# Altium footprint library ref-packages.PCBLIB: 1544 footprints (part 47 of 103)
Each footprint in its own frame and in the unit in brackets; x right, y up, seen from the top. Pads: shape width x height; smd on the part's side, far side on the other; paste and mask are expansions set on the pad; w line width, h text height; cw(c..) or ccw(c..) is an arc to the next point about the centre after c.
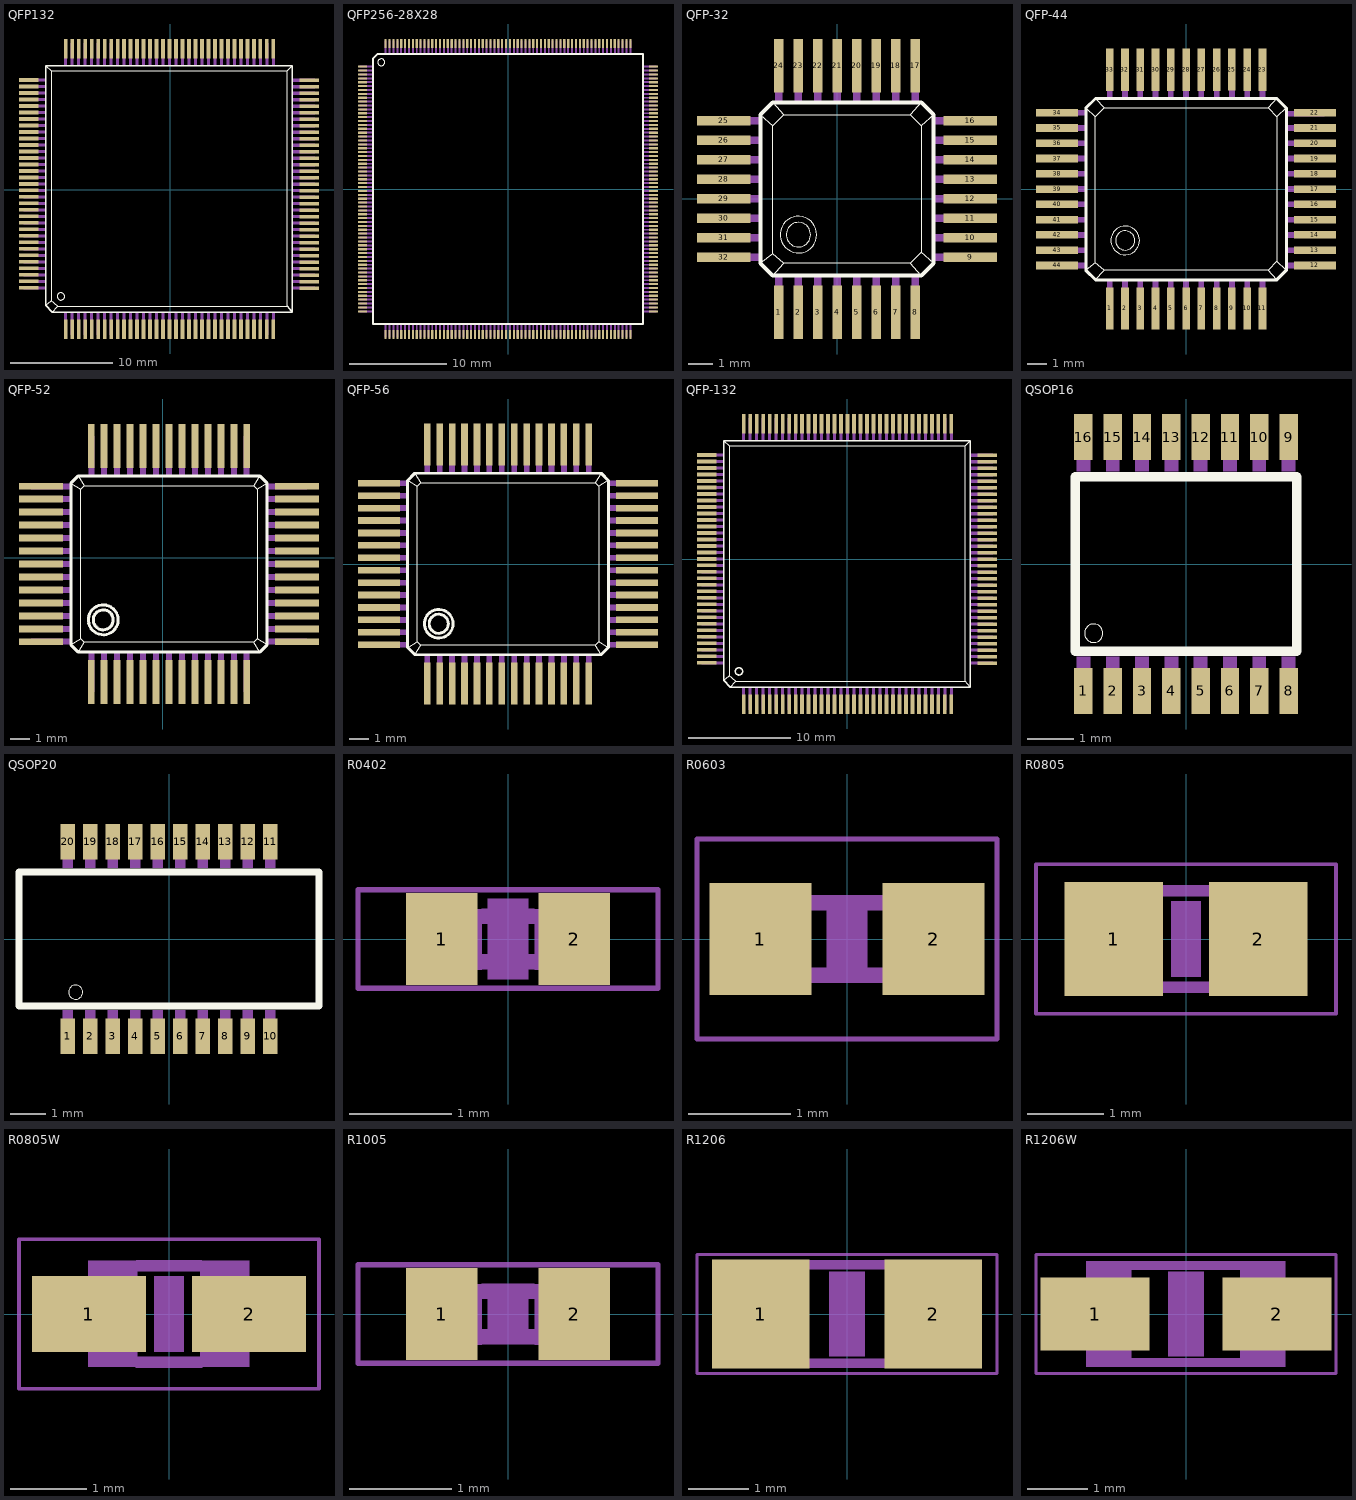
[diagram p46: the footprints below, top view; thin cyan lines are the x and y axes]

## QFP132 [mil]
pads (132):
  rect 14x75 smd: 1(-402,-537) 2(-377,-537) 3(-352,-537) 4(-327,-537) 5(-302,-537) 6(-277,-537) 7(-252,-537) 8(-227,-537) 9(-202,-537) 10(-177,-537) 11(-152,-537) 12(-127,-537) 13(-102,-537) 14(-77,-537) 15(-52,-537) 16(-27,-537) 17(-2,-537) 18(23,-537) 19(48,-537) 20(73,-537) 21(98,-537) 22(123,-537) 23(148,-537) 24(173,-537) 25(198,-537) 26(223,-537) 27(248,-537) 28(273,-537) 29(298,-537) 30(323,-537) 31(348,-537) 32(373,-537) 33(398,-537) 67(398,542) 68(373,542) 69(348,542) 70(323,542) 71(298,542) 72(273,542) 73(248,542) 74(223,542) 75(198,542) 76(173,542) 77(148,542) 78(123,542) 79(98,542) 80(73,542) 81(48,542) 82(23,542) 83(-2,542) 84(-27,542) 85(-52,542) 86(-77,542) 87(-102,542) 88(-127,542) 89(-152,542) 90(-177,542) 91(-202,542) 92(-227,542) 93(-252,542) 94(-277,542) 95(-302,542) 96(-327,542) 97(-352,542) 98(-377,542) 99(-402,542)
  rect 75x14 smd: 34(536,-379) 35(536,-354) 36(536,-329) 37(536,-304) 38(536,-279) 39(536,-254) 40(536,-229) 41(536,-204) 42(536,-179) 43(536,-154) 44(536,-129) 45(536,-104) 46(536,-79) 47(536,-54) 48(536,-29) 49(536,-4) 50(536,21) 51(536,46) 52(536,71) 53(536,96) 54(536,121) 55(536,146) 56(536,171) 57(536,196) 58(536,221) 59(536,246) 60(536,271) 61(536,296) 62(536,321) 63(536,346) 64(536,371) 65(536,396) 66(536,421) 100(-544,422) 101(-544,397) 102(-544,372) 103(-544,347) 104(-544,322) 105(-544,297) 106(-544,272) 107(-544,247) 108(-544,222) 109(-544,197) 110(-544,172) 111(-544,147) 112(-544,122) 113(-544,97) 114(-544,72) 115(-544,47) 116(-544,22) 117(-544,-3) 118(-544,-28) 119(-544,-53) 120(-544,-78) 121(-544,-103) 122(-544,-128) 123(-544,-153) 124(-544,-178) 125(-544,-203) 126(-544,-228) 127(-544,-253) 128(-544,-278) 129(-544,-303) 130(-544,-328) 131(-544,-353) 132(-544,-378)
Top Overlay:
  circle w2: c-420,-411 r14
  lines w2: -478,-445 -457,-428 ; -478,477 -457,457 ; -453,-472 -433,-449 ; 471,477 452,457 ; -457,-428 -457,457 ; -457,-428 -433,-449 ; -457,457 452,457 ; -433,-449 452,-449 452,457
  lines w6: 452,-449 471,-472 ; 471,-472 471,477 -478,477 -478,-445 -453,-472 471,-472
Mechanical 16:
  rectangle: 473,415 558,427
  rectangle: 473,390 558,402
  rectangle: 473,365 558,377
  rectangle: 473,340 558,352
  rectangle: 473,315 558,327
  rectangle: 473,290 558,302
  rectangle: 473,265 558,277
  rectangle: 473,240 558,252
  rectangle: 473,215 558,227
  rectangle: 473,190 558,202
  rectangle: 473,165 558,177
  rectangle: 473,140 558,152
  rectangle: 473,115 558,127
  rectangle: 473,90 558,102
  rectangle: 473,65 558,77
  rectangle: 473,40 558,52
  rectangle: 473,15 558,27
  rectangle: 473,-10 558,2
  rectangle: 473,-35 558,-23
  rectangle: 473,-60 558,-48
  rectangle: 473,-85 558,-73
  rectangle: 473,-110 558,-98
  rectangle: 473,-135 558,-123
  rectangle: 473,-160 558,-148
  rectangle: 473,-185 558,-173
  rectangle: 473,-210 558,-198
  rectangle: 473,-235 558,-223
  rectangle: 473,-260 558,-248
  rectangle: 473,-285 558,-273
  rectangle: 473,-310 558,-298
  rectangle: 473,-335 558,-323
  rectangle: 473,-360 558,-348
  rectangle: 473,-385 558,-373
  rectangle: 317,479 329,564
  rectangle: 292,479 304,564
  rectangle: 267,479 279,564
  rectangle: 242,479 254,564
  rectangle: 217,479 229,564
  rectangle: 192,479 204,564
  rectangle: 167,479 179,564
  rectangle: 142,479 154,564
  rectangle: 117,479 129,564
  rectangle: 92,479 104,564
  rectangle: 67,479 79,564
  rectangle: 42,479 54,564
  rectangle: 17,479 29,564
  rectangle: -8,479 4,564
  rectangle: -33,479 -21,564
  rectangle: -58,479 -46,564
  rectangle: -83,479 -71,564
  rectangle: -108,479 -96,564
  rectangle: -133,479 -121,564
  rectangle: -158,479 -146,564
  rectangle: -183,479 -171,564
  rectangle: -208,479 -196,564
  rectangle: -233,479 -221,564
  rectangle: -258,479 -246,564
  rectangle: -283,479 -271,564
  rectangle: -308,479 -296,564
  rectangle: -333,479 -321,564
  rectangle: -358,479 -346,564
  rectangle: -383,479 -371,564
  rectangle: -408,479 -396,564
  rectangle: 342,479 354,564
  rectangle: 367,479 379,564
  rectangle: 392,479 404,564
  rectangle: -565,416 -480,428
  rectangle: -565,391 -480,403
  rectangle: -565,366 -480,378
  rectangle: -565,341 -480,353
  rectangle: -565,316 -480,328
  rectangle: -565,291 -480,303
  rectangle: -565,266 -480,278
  rectangle: -565,241 -480,253
  rectangle: -565,216 -480,228
  rectangle: -565,191 -480,203
  rectangle: -565,166 -480,178
  rectangle: -565,141 -480,153
  rectangle: -565,116 -480,128
  rectangle: -565,91 -480,103
  rectangle: -565,66 -480,78
  rectangle: -565,41 -480,53
  rectangle: -565,16 -480,28
  rectangle: -565,-9 -480,3
  rectangle: -565,-34 -480,-22
  rectangle: -565,-59 -480,-47
  rectangle: -565,-84 -480,-72
  rectangle: -565,-109 -480,-97
  rectangle: -565,-134 -480,-122
  rectangle: -565,-159 -480,-147
  rectangle: -565,-184 -480,-172
  rectangle: -565,-209 -480,-197
  rectangle: -565,-234 -480,-222
  rectangle: -565,-259 -480,-247
  rectangle: -565,-284 -480,-272
  rectangle: -565,-309 -480,-297
  rectangle: -565,-334 -480,-322
  rectangle: -565,-359 -480,-347
  rectangle: -565,-384 -480,-372
  rectangle: 392,-559 404,-474
  rectangle: 367,-559 379,-474
  rectangle: 342,-559 354,-474
  rectangle: 317,-559 329,-474
  rectangle: 292,-559 304,-474
  rectangle: 267,-559 279,-474
  rectangle: 242,-559 254,-474
  rectangle: 217,-559 229,-474
  rectangle: 192,-559 204,-474
  rectangle: 167,-559 179,-474
  rectangle: 142,-559 154,-474
  rectangle: 117,-559 129,-474
  rectangle: 92,-559 104,-474
  rectangle: 67,-559 79,-474
  rectangle: 42,-559 54,-474
  rectangle: 17,-559 29,-474
  rectangle: -8,-559 4,-474
  rectangle: -33,-559 -21,-474
  rectangle: -58,-559 -46,-474
  rectangle: -83,-559 -71,-474
  rectangle: -108,-559 -96,-474
  rectangle: -133,-559 -121,-474
  rectangle: -158,-559 -146,-474
  rectangle: -183,-559 -171,-474
  rectangle: -208,-559 -196,-474
  rectangle: -233,-559 -221,-474
  rectangle: -258,-559 -246,-474
  rectangle: -283,-559 -271,-474
  rectangle: -308,-559 -296,-474
  rectangle: -333,-559 -321,-474
  rectangle: -358,-559 -346,-474
  rectangle: -383,-559 -371,-474
  rectangle: -408,-559 -396,-474

## QFP256-28X28 [mm]
pads (256):
  rect 0.9x0.22 smd: 1(-14.975,12.6) 2(-14.975,12.2) 3(-14.975,11.8) 4(-14.975,11.4) 5(-14.975,11) 6(-14.975,10.6) 7(-14.975,10.2) 8(-14.975,9.8) 9(-14.975,9.4) 10(-14.975,9) 11(-14.975,8.6) 12(-14.975,8.2) 13(-14.975,7.8) 14(-14.975,7.4) 15(-14.975,7) 16(-14.975,6.6) 17(-14.975,6.2) 18(-14.975,5.8) 19(-14.975,5.4) 20(-14.975,5) 21(-14.975,4.6) 22(-14.975,4.2) 23(-14.975,3.8) 24(-14.975,3.4) 25(-14.975,3) 26(-14.975,2.6) 27(-14.975,2.2) 28(-14.975,1.8) 29(-14.975,1.4) 30(-14.975,1) 31(-14.975,0.6) 32(-14.975,0.2) 33(-14.975,-0.2) 34(-14.975,-0.6) 35(-14.975,-1) 36(-14.975,-1.4) 37(-14.975,-1.8) 38(-14.975,-2.2) 39(-14.975,-2.6) 40(-14.975,-3) 41(-14.975,-3.4) 42(-14.975,-3.8) 43(-14.975,-4.2) 44(-14.975,-4.6) 45(-14.975,-5) 46(-14.975,-5.4) 47(-14.975,-5.8) 48(-14.975,-6.2) 49(-14.975,-6.6) 50(-14.975,-7) 51(-14.975,-7.4) 52(-14.975,-7.8) 53(-14.975,-8.2) 54(-14.975,-8.6) 55(-14.975,-9) 56(-14.975,-9.4) 57(-14.975,-9.8) 58(-14.975,-10.2) 59(-14.975,-10.6) 60(-14.975,-11) 61(-14.975,-11.4) 62(-14.975,-11.8) 63(-14.975,-12.2) 64(-14.975,-12.6) 129(14.975,-12.6) 130(14.975,-12.2) 131(14.975,-11.8) 132(14.975,-11.4) 133(14.975,-11) 134(14.975,-10.6) 135(14.975,-10.2) 136(14.975,-9.8) 137(14.975,-9.4) 138(14.975,-9) 139(14.975,-8.6) 140(14.975,-8.2) 141(14.975,-7.8) 142(14.975,-7.4) 143(14.975,-7) 144(14.975,-6.6) 145(14.975,-6.2) 146(14.975,-5.8) 147(14.975,-5.4) 148(14.975,-5) 149(14.975,-4.6) 150(14.975,-4.2) 151(14.975,-3.8) 152(14.975,-3.4) 153(14.975,-3) 154(14.975,-2.6) 155(14.975,-2.2) 156(14.975,-1.8) 157(14.975,-1.4) 158(14.975,-1) 159(14.975,-0.6) 160(14.975,-0.2) 161(14.975,0.2) 162(14.975,0.6) 163(14.975,1) 164(14.975,1.4) 165(14.975,1.8) 166(14.975,2.2) 167(14.975,2.6) 168(14.975,3) 169(14.975,3.4) 170(14.975,3.8) 171(14.975,4.2) 172(14.975,4.6) 173(14.975,5) 174(14.975,5.4) 175(14.975,5.8) 176(14.975,6.2) 177(14.975,6.6) 178(14.975,7) 179(14.975,7.4) 180(14.975,7.8) 181(14.975,8.2) 182(14.975,8.6) 183(14.975,9) 184(14.975,9.4) 185(14.975,9.8) 186(14.975,10.2) 187(14.975,10.6) 188(14.975,11) 189(14.975,11.4) 190(14.975,11.8) 191(14.975,12.2) 192(14.975,12.6)
  rect 0.22x0.9 smd: 65(-12.6,-14.975) 66(-12.2,-14.975) 67(-11.8,-14.975) 68(-11.4,-14.975) 69(-11,-14.975) 70(-10.6,-14.975) 71(-10.2,-14.975) 72(-9.8,-14.975) 73(-9.4,-14.975) 74(-9,-14.975) 75(-8.6,-14.975) 76(-8.2,-14.975) 77(-7.8,-14.975) 78(-7.4,-14.975) 79(-7,-14.975) 80(-6.6,-14.975) 81(-6.2,-14.975) 82(-5.8,-14.975) 83(-5.4,-14.975) 84(-5,-14.975) 85(-4.6,-14.975) 86(-4.2,-14.975) 87(-3.8,-14.975) 88(-3.4,-14.975) 89(-3,-14.975) 90(-2.6,-14.975) 91(-2.2,-14.975) 92(-1.8,-14.975) 93(-1.4,-14.975) 94(-1,-14.975) 95(-0.6,-14.975) 96(-0.2,-14.975) 97(0.2,-14.975) 98(0.6,-14.975) 99(1,-14.975) 100(1.4,-14.975) 101(1.8,-14.975) 102(2.2,-14.975) 103(2.6,-14.975) 104(3,-14.975) 105(3.4,-14.975) 106(3.8,-14.975) 107(4.2,-14.975) 108(4.6,-14.975) 109(5,-14.975) 110(5.4,-14.975) 111(5.8,-14.975) 112(6.2,-14.975) 113(6.6,-14.975) 114(7,-14.975) 115(7.4,-14.975) 116(7.8,-14.975) 117(8.2,-14.975) 118(8.6,-14.975) 119(9,-14.975) 120(9.4,-14.975) 121(9.8,-14.975) 122(10.2,-14.975) 123(10.6,-14.975) 124(11,-14.975) 125(11.4,-14.975) 126(11.8,-14.975) 127(12.2,-14.975) 128(12.6,-14.975) 193(12.6,14.975) 194(12.2,14.975) 195(11.8,14.975) 196(11.4,14.975) 197(11,14.975) 198(10.6,14.975) 199(10.2,14.975) 200(9.8,14.975) 201(9.4,14.975) 202(9,14.975) 203(8.6,14.975) 204(8.2,14.975) 205(7.8,14.975) 206(7.4,14.975) 207(7,14.975) 208(6.6,14.975) 209(6.2,14.975) 210(5.8,14.975) 211(5.4,14.975) 212(5,14.975) 213(4.6,14.975) 214(4.2,14.975) 215(3.8,14.975) 216(3.4,14.975) 217(3,14.975) 218(2.6,14.975) 219(2.2,14.975) 220(1.8,14.975) 221(1.4,14.975) 222(1,14.975) 223(0.6,14.975) 224(0.2,14.975) 225(-0.2,14.975) 226(-0.6,14.975) 227(-1,14.975) 228(-1.4,14.975) 229(-1.8,14.975) 230(-2.2,14.975) 231(-2.6,14.975) 232(-3,14.975) 233(-3.4,14.975) 234(-3.8,14.975) 235(-4.2,14.975) 236(-4.6,14.975) 237(-5,14.975) 238(-5.4,14.975) 239(-5.8,14.975) 240(-6.2,14.975) 241(-6.6,14.975) 242(-7,14.975) 243(-7.4,14.975) 244(-7.8,14.975) 245(-8.2,14.975) 246(-8.6,14.975) 247(-9,14.975) 248(-9.4,14.975) 249(-9.8,14.975) 250(-10.2,14.975) 251(-10.6,14.975) 252(-11,14.975) 253(-11.4,14.975) 254(-11.8,14.975) 255(-12.2,14.975) 256(-12.6,14.975)
Top Overlay:
  circle w0: c-13.05,13.05 r0.354
  lines w0.203: -13.9,-13.9 13.9,-13.9 13.9,13.9 -13.45,13.9 -13.9,13.45 -13.9,-13.9
Top Solder:
  drawing of 256 lines, arcs and shapes, not listed
Mechanical 16:
  drawing of 256 lines, arcs and shapes, not listed

## QFP-32 [mil]
pads (32):
  rect 15.75x86.61 smd: 1(-94.49,-183.07) 2(-62.99,-183.07) 3(-31.5,-183.07) 4(0,-183.07) 5(31.5,-183.07) 6(62.99,-183.07) 7(94.49,-183.07) 8(125.98,-183.07) 17(125.98,214.57) 18(94.49,214.57) 19(62.99,214.57) 20(31.5,214.57) 21(0,214.57) 22(-31.5,214.57) 23(-62.99,214.57) 24(-94.49,214.57)
  rect 86.61x15.75 smd: 9(214.57,-94.49) 10(214.57,-62.99) 11(214.57,-31.5) 12(214.57,0) 13(214.57,31.5) 14(214.57,62.99) 15(214.57,94.49) 16(214.57,125.98) 25(-183.07,125.98) 26(-183.07,94.49) 27(-183.07,62.99) 28(-183.07,31.5) 29(-183.07,0) 30(-183.07,-31.5) 31(-183.07,-62.99) 32(-183.07,-94.49)
Top Overlay:
  circle w2: c-62.6,-57.91 r29.53
  circle w2: c-62.6,-57.91 r19.69
  lines w2: -124.02,-104.33 -104.33,-88.58 ; -124.02,135.83 -104.33,117.72 ; -104.33,-124.02 -86.22,-104.33 ; -104.33,155.51 -86.22,135.83 ; 135.83,-124.02 117.72,-104.33 ; 135.83,155.51 117.72,135.83 ; 155.51,-104.33 135.83,-86.22 ; 155.51,135.83 135.83,117.72 ; -104.33,-88.58 -104.33,117.72 ; -104.33,-88.58 -86.22,-104.33 ; -104.33,117.72 -86.22,135.83 ; -86.22,-104.33 117.72,-104.33 ; -86.22,135.83 117.72,135.83 ; 117.72,-104.33 135.83,-86.22 ; 117.72,135.83 135.83,117.72 ; 135.83,-86.22 135.83,117.72
  lines w6: -124.02,-104.33 -104.33,-124.02 135.83,-124.02 155.51,-104.33 155.51,135.83 135.83,155.51 -104.33,155.51 -124.02,135.83 -124.02,-104.33
Mechanical 16:
  rectangle: -100.39,155.51 -88.58,234.25
  rectangle: -68.9,155.51 -57.09,234.25
  rectangle: -37.4,155.51 -25.59,234.25
  rectangle: -5.91,155.51 5.91,234.25
  rectangle: 25.59,155.51 37.4,234.25
  rectangle: 57.09,155.51 68.9,234.25
  rectangle: 88.58,155.51 100.39,234.25
  rectangle: 120.08,155.51 131.89,234.25
  rectangle: 155.51,120.08 234.25,131.89
  rectangle: 155.51,88.58 234.25,100.39
  rectangle: 155.51,57.09 234.25,68.9
  rectangle: 155.51,25.59 234.25,37.4
  rectangle: 155.51,-5.91 234.25,5.91
  rectangle: 155.51,-37.4 234.25,-25.59
  rectangle: 155.51,-68.9 234.25,-57.09
  rectangle: 155.51,-100.39 234.25,-88.58
  rectangle: 120.08,-202.76 131.89,-124.02
  rectangle: 88.58,-202.76 100.39,-124.02
  rectangle: 57.09,-202.76 68.9,-124.02
  rectangle: 25.59,-202.76 37.4,-124.02
  rectangle: -5.91,-202.76 5.91,-124.02
  rectangle: -37.4,-202.76 -25.59,-124.02
  rectangle: -68.9,-202.76 -57.09,-124.02
  rectangle: -100.39,-202.76 -88.58,-124.02
  rectangle: -202.76,-100.39 -124.02,-88.58
  rectangle: -202.76,-68.9 -124.02,-57.09
  rectangle: -202.76,-37.4 -124.02,-25.59
  rectangle: -202.76,-5.91 -124.02,5.91
  rectangle: -202.76,25.59 -124.02,37.4
  rectangle: -202.76,57.09 -124.02,68.9
  rectangle: -202.76,88.58 -124.02,100.39
  rectangle: -202.76,120.08 -124.02,131.89

## QFP-44 [mm]
pads (44):
  rect 0.4x2.2 smd: 1(-4,-6.25) 2(-3.2,-6.25) 3(-2.4,-6.25) 4(-1.6,-6.25) 5(-0.8,-6.25) 6(0,-6.25) 7(0.8,-6.25) 8(1.6,-6.25) 9(2.4,-6.24) 10(3.2,-6.25) 11(4,-6.25) 23(4,6.25) 24(3.2,6.25) 25(2.4,6.26) 26(1.6,6.25) 27(0.8,6.25) 28(0,6.25) 29(-0.8,6.25) 30(-1.6,6.25) 31(-2.4,6.25) 32(-3.2,6.25) 33(-4,6.25)
  rect 2.2x0.4 smd: 12(6.75,-4) 13(6.75,-3.2) 14(6.75,-2.4) 15(6.75,-1.6) 16(6.75,-0.8) 17(6.75,0) 18(6.75,0.8) 19(6.75,1.6) 20(6.74,2.4) 21(6.75,3.2) 22(6.75,4) 34(-6.75,4) 35(-6.75,3.2) 36(-6.76,2.4) 37(-6.75,1.6) 38(-6.75,0.8) 39(-6.75,0) 40(-6.75,-0.8) 41(-6.75,-1.6) 42(-6.75,-2.4) 43(-6.75,-3.2) 44(-6.75,-4)
Top Overlay:
  circle w0.051: c-3.19,-2.69 r0.75
  circle w0.051: c-3.19,-2.69 r0.5
  lines w0.051: -5.25,-4.25 -4.75,-3.85 ; -5.25,4.25 -4.75,3.79 ; -4.75,-4.75 -4.29,-4.25 ; -4.75,4.75 -4.29,4.25 ; 4.75,-4.75 4.29,-4.25 ; 4.75,4.75 4.29,4.25 ; 5.25,-4.25 4.75,-3.79 ; 5.25,4.25 4.75,3.79 ; -4.75,-3.85 -4.75,3.79 ; -4.75,-3.85 -4.29,-4.25 ; -4.75,3.79 -4.29,4.25 ; -4.29,-4.25 4.29,-4.25 ; -4.29,4.25 4.29,4.25 ; 4.29,-4.25 4.75,-3.79 ; 4.29,4.25 4.75,3.79 ; 4.75,-3.79 4.75,3.79
  lines w0.152: -5.25,-4.25 -4.75,-4.75 4.75,-4.75 5.25,-4.25 5.25,4.25 4.75,4.75 -4.75,4.75 -5.25,4.25 -5.25,-4.25
Mechanical 16:
  rectangle: -4.15,4.75 -3.85,6.75
  rectangle: -3.35,4.75 -3.05,6.75
  rectangle: -2.55,4.75 -2.25,6.75
  rectangle: -1.75,4.75 -1.45,6.75
  rectangle: -0.95,4.75 -0.65,6.75
  rectangle: -0.15,4.75 0.15,6.75
  rectangle: 0.65,4.75 0.95,6.75
  rectangle: 1.45,4.75 1.75,6.75
  rectangle: 2.25,4.75 2.55,6.75
  rectangle: 3.05,4.75 3.35,6.75
  rectangle: 3.85,4.75 4.15,6.75
  rectangle: 5.25,3.79 7.25,4.09
  rectangle: 5.25,3.05 7.25,3.35
  rectangle: 5.25,2.25 7.25,2.55
  rectangle: 5.25,1.45 7.25,1.75
  rectangle: 5.25,0.65 7.25,0.95
  rectangle: 5.25,-0.15 7.25,0.15
  rectangle: 5.25,-0.95 7.25,-0.65
  rectangle: 5.25,-1.75 7.25,-1.45
  rectangle: 5.25,-2.55 7.25,-2.25
  rectangle: 5.25,-3.35 7.25,-3.05
  rectangle: 5.25,-4.15 7.25,-3.85
  rectangle: 3.85,-6.75 4.15,-4.75
  rectangle: 3.05,-6.75 3.35,-4.75
  rectangle: 2.25,-6.75 2.55,-4.75
  rectangle: 1.45,-6.75 1.75,-4.75
  rectangle: 0.65,-6.75 0.95,-4.75
  rectangle: -0.15,-6.75 0.15,-4.75
  rectangle: -0.95,-6.75 -0.65,-4.75
  rectangle: -1.75,-6.75 -1.45,-4.75
  rectangle: -2.55,-6.75 -2.25,-4.75
  rectangle: -3.35,-6.75 -3.05,-4.75
  rectangle: -4.15,-6.75 -3.85,-4.75
  rectangle: -7.25,-4.15 -5.25,-3.85
  rectangle: -7.25,-3.35 -5.25,-3.05
  rectangle: -7.25,-2.55 -5.25,-2.25
  rectangle: -7.25,-1.75 -5.25,-1.45
  rectangle: -7.25,-0.95 -5.25,-0.65
  rectangle: -7.25,-0.15 -5.25,0.15
  rectangle: -7.25,0.65 -5.25,0.95
  rectangle: -7.25,1.45 -5.25,1.75
  rectangle: -7.25,2.25 -5.25,2.55
  rectangle: -7.25,3.05 -5.25,3.35
  rectangle: -7.25,3.849 -5.25,4.149

## QFP-52 [mm]
pads (52):
  rect 0.35x2.2 smd: 1(-3.575,-6.25) 2(-2.925,-6.25) 3(-2.275,-6.25) 4(-1.625,-6.25) 5(-0.975,-6.25) 6(-0.325,-6.25) 7(0.325,-6.25) 8(0.975,-6.25) 9(1.625,-6.25) 10(2.275,-6.25) 11(2.925,-6.25) 12(3.575,-6.25) 13(4.225,-6.25) 27(4.225,5.6) 28(3.575,5.6) 29(2.925,5.6) 30(2.275,5.6) 31(1.625,5.6) 32(0.975,5.6) 33(0.325,5.6) 34(-0.325,5.6) 35(-0.975,5.6) 36(-1.625,5.6) 37(-2.275,5.6) 38(-2.925,5.6) 39(-3.575,5.6)
  rect 2.2x0.35 smd: 14(6.75,-4.225) 15(6.75,-3.575) 16(6.75,-2.925) 17(6.75,-2.275) 18(6.75,-1.625) 19(6.75,-0.975) 20(6.75,-0.325) 21(6.75,0.325) 22(6.75,0.975) 23(6.75,1.625) 24(6.75,2.275) 25(6.75,2.925) 26(6.75,3.575) 40(-6.1,3.575) 41(-6.1,2.925) 42(-6.1,2.275) 43(-6.1,1.625) 44(-6.1,0.975) 45(-6.1,0.325) 46(-6.1,-0.325) 47(-6.1,-0.975) 48(-6.1,-1.625) 49(-6.1,-2.275) 50(-6.1,-2.925) 51(-6.1,-3.575) 52(-6.1,-4.225)
Top Overlay:
  circle w0.152: c-2.974,-3.127 r0.75
  circle w0.152: c-2.974,-3.127 r0.501
  lines w0.051: -4.6,-4.375 -4.1,-4.075 ; -4.6,3.725 -4.1,3.425 ; -4.225,4.1 -3.925,3.6 ; -4.224,-4.751 -3.925,-4.25 ; 4.874,-4.751 4.575,-4.25 ; 4.875,4.1 4.575,3.6 ; 5.25,-4.375 4.75,-4.075 ; 5.25,3.725 4.75,3.425 ; -4.1,-4.075 -4.1,3.425 ; -4.1,-4.075 -3.925,-4.25 ; -4.1,3.425 -3.925,3.6 ; -3.925,-4.25 4.575,-4.25 ; -3.925,3.6 4.575,3.6 ; 4.575,-4.25 4.75,-4.075 ; 4.575,3.6 4.75,3.425 ; 4.75,-4.075 4.75,3.425
  lines w0.152: -4.6,-4.375 -4.6,3.725 -4.225,4.1 4.875,4.1 5.25,3.725 5.25,-4.375 4.874,-4.751 -4.224,-4.751 -4.6,-4.375
Mechanical 16:
  rectangle: -3.725,4.1 -3.425,6.1
  rectangle: -3.075,4.1 -2.775,6.1
  rectangle: -2.425,4.1 -2.125,6.1
  rectangle: -1.775,4.1 -1.475,6.1
  rectangle: -1.125,4.1 -0.825,6.1
  rectangle: -0.475,4.1 -0.175,6.1
  rectangle: 0.175,4.1 0.475,6.1
  rectangle: 0.825,4.1 1.125,6.1
  rectangle: 1.475,4.1 1.775,6.1
  rectangle: 2.125,4.1 2.425,6.1
  rectangle: 2.775,4.1 3.075,6.1
  rectangle: 3.425,4.1 3.725,6.1
  rectangle: 4.075,4.1 4.375,6.1
  rectangle: 5.25,3.425 7.25,3.725
  rectangle: 5.25,2.775 7.25,3.075
  rectangle: 5.25,2.125 7.25,2.425
  rectangle: 5.25,1.475 7.25,1.775
  rectangle: 5.25,0.825 7.25,1.125
  rectangle: 5.25,0.175 7.25,0.475
  rectangle: 5.25,-0.475 7.25,-0.175
  rectangle: 5.25,-1.125 7.25,-0.825
  rectangle: 5.25,-1.775 7.25,-1.475
  rectangle: 5.25,-2.425 7.25,-2.125
  rectangle: 5.25,-3.075 7.25,-2.775
  rectangle: 5.25,-3.725 7.25,-3.425
  rectangle: 5.25,-4.375 7.25,-4.075
  rectangle: -6.6,-4.375 -4.6,-4.075
  rectangle: -6.6,-3.725 -4.6,-3.425
  rectangle: -6.6,-3.075 -4.6,-2.775
  rectangle: -6.6,-2.425 -4.6,-2.125
  rectangle: -6.6,-1.775 -4.6,-1.475
  rectangle: -6.6,-1.125 -4.6,-0.825
  rectangle: -6.6,-0.475 -4.6,-0.175
  rectangle: -6.6,0.175 -4.6,0.475
  rectangle: -6.6,0.825 -4.6,1.125
  rectangle: -6.6,1.475 -4.6,1.775
  rectangle: -6.6,2.125 -4.6,2.425
  rectangle: -6.6,2.775 -4.6,3.075
  rectangle: -6.6,3.425 -4.6,3.725
  rectangle: 4.075,-6.751 4.375,-4.751
  rectangle: 3.425,-6.751 3.725,-4.751
  rectangle: 2.775,-6.751 3.075,-4.751
  rectangle: 2.125,-6.751 2.425,-4.751
  rectangle: 1.475,-6.751 1.775,-4.751
  rectangle: 0.825,-6.751 1.125,-4.751
  rectangle: 0.175,-6.751 0.475,-4.751
  rectangle: -0.475,-6.751 -0.175,-4.751
  rectangle: -1.125,-6.751 -0.825,-4.751
  rectangle: -1.775,-6.751 -1.475,-4.751
  rectangle: -2.425,-6.751 -2.125,-4.751
  rectangle: -3.075,-6.751 -2.775,-4.751
  rectangle: -3.725,-6.751 -3.425,-4.751

## QFP-56 [mm]
pads (56):
  rect 0.35x2.2 smd: 1(-4.225,-6.25) 2(-3.575,-6.25) 3(-2.925,-6.25) 4(-2.275,-6.25) 5(-1.625,-6.25) 6(-0.975,-6.25) 7(-0.325,-6.25) 8(0.325,-6.25) 9(0.975,-6.25) 10(1.625,-6.25) 11(2.275,-6.25) 12(2.925,-6.25) 13(3.575,-6.25) 14(4.225,-6.25) 29(4.225,6.25) 30(3.575,6.25) 31(2.925,6.25) 32(2.275,6.25) 33(1.625,6.25) 34(0.975,6.25) 35(0.325,6.25) 36(-0.325,6.25) 37(-0.975,6.25) 38(-1.625,6.25) 39(-2.275,6.25) 40(-2.925,6.25) 41(-3.575,6.25) 42(-4.225,6.25)
  rect 2.2x0.35 smd: 15(6.75,-4.225) 16(6.75,-3.575) 17(6.75,-2.925) 18(6.75,-2.275) 19(6.75,-1.625) 20(6.75,-0.975) 21(6.75,-0.325) 22(6.75,0.325) 23(6.75,0.975) 24(6.75,1.625) 25(6.75,2.275) 26(6.75,2.925) 27(6.75,3.575) 28(6.75,4.225) 43(-6.75,4.225) 44(-6.75,3.575) 45(-6.75,2.925) 46(-6.75,2.275) 47(-6.75,1.625) 48(-6.75,0.975) 49(-6.75,0.325) 50(-6.75,-0.325) 51(-6.75,-0.975) 52(-6.75,-1.625) 53(-6.75,-2.275) 54(-6.75,-2.925) 55(-6.75,-3.575) 56(-6.75,-4.225)
Top Overlay:
  circle w0.152: c-3.624,-3.127 r0.75
  circle w0.152: c-3.624,-3.127 r0.501
  lines w0.051: -5.25,-4.375 -4.75,-4.075 ; -5.25,4.375 -4.75,4.075 ; -4.875,4.75 -4.575,4.25 ; -4.874,-4.751 -4.575,-4.25 ; 4.874,-4.751 4.575,-4.25 ; 4.875,4.75 4.575,4.25 ; 5.25,-4.375 4.75,-4.075 ; 5.25,4.375 4.75,4.075 ; -4.75,-4.075 -4.75,4.075 ; -4.75,-4.075 -4.575,-4.25 ; -4.75,4.075 -4.575,4.25 ; -4.575,-4.25 4.575,-4.25 ; -4.575,4.25 4.575,4.25 ; 4.575,-4.25 4.75,-4.075 ; 4.575,4.25 4.75,4.075 ; 4.75,-4.075 4.75,4.075
  lines w0.152: -5.25,-4.375 -5.25,4.375 -4.875,4.75 4.875,4.75 5.25,4.375 5.25,-4.375 4.874,-4.751 -4.874,-4.751 -5.25,-4.375
Mechanical 16:
  rectangle: -4.375,4.75 -4.075,6.75
  rectangle: -3.725,4.75 -3.425,6.75
  rectangle: -3.075,4.75 -2.775,6.75
  rectangle: -2.425,4.75 -2.125,6.75
  rectangle: -1.775,4.75 -1.475,6.75
  rectangle: -1.125,4.75 -0.825,6.75
  rectangle: -0.475,4.75 -0.175,6.75
  rectangle: 0.175,4.75 0.475,6.75
  rectangle: 0.825,4.75 1.125,6.75
  rectangle: 1.475,4.75 1.775,6.75
  rectangle: 2.125,4.75 2.425,6.75
  rectangle: 2.775,4.75 3.075,6.75
  rectangle: 3.425,4.75 3.725,6.75
  rectangle: 4.075,4.75 4.375,6.75
  rectangle: 5.25,4.075 7.25,4.375
  rectangle: 5.25,3.425 7.25,3.725
  rectangle: 5.25,2.775 7.25,3.075
  rectangle: 5.25,2.125 7.25,2.425
  rectangle: 5.25,1.475 7.25,1.775
  rectangle: 5.25,0.825 7.25,1.125
  rectangle: 5.25,0.175 7.25,0.475
  rectangle: 5.25,-0.475 7.25,-0.175
  rectangle: 5.25,-1.125 7.25,-0.825
  rectangle: 5.25,-1.775 7.25,-1.475
  rectangle: 5.25,-2.425 7.25,-2.125
  rectangle: 5.25,-3.075 7.25,-2.775
  rectangle: 5.25,-3.725 7.25,-3.425
  rectangle: 5.25,-4.375 7.25,-4.075
  rectangle: -7.25,-4.375 -5.25,-4.075
  rectangle: -7.25,-3.725 -5.25,-3.425
  rectangle: -7.25,-3.075 -5.25,-2.775
  rectangle: -7.25,-2.425 -5.25,-2.125
  rectangle: -7.25,-1.775 -5.25,-1.475
  rectangle: -7.25,-1.125 -5.25,-0.825
  rectangle: -7.25,-0.475 -5.25,-0.175
  rectangle: -7.25,0.175 -5.25,0.475
  rectangle: -7.25,0.825 -5.25,1.125
  rectangle: -7.25,1.475 -5.25,1.775
  rectangle: -7.25,2.125 -5.25,2.425
  rectangle: -7.25,2.775 -5.25,3.075
  rectangle: -7.25,3.425 -5.25,3.725
  rectangle: -7.25,4.075 -5.25,4.375
  rectangle: 4.075,-6.751 4.375,-4.751
  rectangle: 3.425,-6.751 3.725,-4.751
  rectangle: 2.775,-6.751 3.075,-4.751
  rectangle: 2.125,-6.751 2.425,-4.751
  rectangle: 1.475,-6.751 1.775,-4.751
  rectangle: 0.825,-6.751 1.125,-4.751
  rectangle: 0.175,-6.751 0.475,-4.751
  rectangle: -0.475,-6.751 -0.175,-4.751
  rectangle: -1.125,-6.751 -0.825,-4.751
  rectangle: -1.775,-6.751 -1.475,-4.751
  rectangle: -2.425,-6.751 -2.125,-4.751
  rectangle: -3.075,-6.751 -2.775,-4.751
  rectangle: -3.725,-6.751 -3.425,-4.751
  rectangle: -4.375,-6.751 -4.075,-4.751

## QFP-132 [mil]
pads (132):
  rect 14x75 smd: 1(-399,-557) 2(-374,-557) 3(-349,-557) 4(-324,-557) 5(-299,-557) 6(-274,-557) 7(-249,-557) 8(-224,-557) 9(-199,-557) 10(-174,-557) 11(-149,-557) 12(-124,-557) 13(-99,-557) 14(-74,-557) 15(-49,-557) 16(-24,-557) 17(1,-557) 18(26,-557) 19(51,-557) 20(76,-557) 21(101,-557) 22(126,-557) 23(151,-557) 24(176,-557) 25(201,-557) 26(226,-557) 27(251,-557) 28(276,-557) 29(301,-557) 30(326,-557) 31(351,-557) 32(376,-557) 33(401,-557) 67(401,522) 68(376,522) 69(351,522) 70(326,522) 71(301,522) 72(276,522) 73(251,522) 74(226,522) 75(201,522) 76(176,522) 77(151,522) 78(126,522) 79(101,522) 80(76,522) 81(51,522) 82(26,522) 83(1,522) 84(-24,522) 85(-49,522) 86(-74,522) 87(-99,522) 88(-124,522) 89(-149,522) 90(-174,522) 91(-199,522) 92(-224,522) 93(-249,522) 94(-274,522) 95(-299,522) 96(-324,522) 97(-349,522) 98(-374,522) 99(-399,522)
  rect 75x14 smd: 34(539,-399) 35(539,-374) 36(539,-349) 37(539,-324) 38(539,-299) 39(539,-274) 40(539,-249) 41(539,-224) 42(539,-199) 43(539,-174) 44(539,-149) 45(539,-124) 46(539,-99) 47(539,-74) 48(539,-49) 49(539,-24) 50(539,1) 51(539,26) 52(539,51) 53(539,76) 54(539,101) 55(539,126) 56(539,151) 57(539,176) 58(539,201) 59(539,226) 60(539,251) 61(539,276) 62(539,301) 63(539,326) 64(539,351) 65(539,376) 66(539,401) 100(-541,402) 101(-541,377) 102(-541,352) 103(-541,327) 104(-541,302) 105(-541,277) 106(-541,252) 107(-541,227) 108(-541,202) 109(-541,177) 110(-541,152) 111(-541,127) 112(-541,102) 113(-541,77) 114(-541,52) 115(-541,27) 116(-541,2) 117(-541,-23) 118(-541,-48) 119(-541,-73) 120(-541,-98) 121(-541,-123) 122(-541,-148) 123(-541,-173) 124(-541,-198) 125(-541,-223) 126(-541,-248) 127(-541,-273) 128(-541,-298) 129(-541,-323) 130(-541,-348) 131(-541,-373) 132(-541,-398)
Top Overlay:
  circle w6: c-417,-431 r14
  lines w2: -475,-465 -454,-448 ; -475,457 -454,437 ; -450,-492 -430,-469 ; 474,-492 455,-469 ; 474,457 455,437 ; -454,-448 -454,437 ; -454,-448 -430,-469 ; -454,437 455,437 ; -430,-469 455,-469 ; 455,-469 455,437
  lines w6: -475,-465 -475,457 474,457 474,-492 -450,-492 -475,-465
Mechanical 16:
  rectangle: 476,395 561,407
  rectangle: 476,370 561,382
  rectangle: 476,345 561,357
  rectangle: 476,320 561,332
  rectangle: 476,295 561,307
  rectangle: 476,270 561,282
  rectangle: 476,245 561,257
  rectangle: 476,220 561,232
  rectangle: 476,195 561,207
  rectangle: 476,170 561,182
  rectangle: 476,145 561,157
  rectangle: 476,120 561,132
  rectangle: 476,95 561,107
  rectangle: 476,70 561,82
  rectangle: 476,45 561,57
  rectangle: 476,20 561,32
  rectangle: 476,-5 561,7
  rectangle: 476,-30 561,-18
  rectangle: 476,-55 561,-43
  rectangle: 476,-80 561,-68
  rectangle: 476,-105 561,-93
  rectangle: 476,-130 561,-118
  rectangle: 476,-155 561,-143
  rectangle: 476,-180 561,-168
  rectangle: 476,-205 561,-193
  rectangle: 476,-230 561,-218
  rectangle: 476,-255 561,-243
  rectangle: 476,-280 561,-268
  rectangle: 476,-305 561,-293
  rectangle: 476,-330 561,-318
  rectangle: 476,-355 561,-343
  rectangle: 476,-380 561,-368
  rectangle: 476,-405 561,-393
  rectangle: 320,459 332,544
  rectangle: 295,459 307,544
  rectangle: 270,459 282,544
  rectangle: 245,459 257,544
  rectangle: 220,459 232,544
  rectangle: 195,459 207,544
  rectangle: 170,459 182,544
  rectangle: 145,459 157,544
  rectangle: 120,459 132,544
  rectangle: 95,459 107,544
  rectangle: 70,459 82,544
  rectangle: 45,459 57,544
  rectangle: 20,459 32,544
  rectangle: -5,459 7,544
  rectangle: -30,459 -18,544
  rectangle: -55,459 -43,544
  rectangle: -80,459 -68,544
  rectangle: -105,459 -93,544
  rectangle: -130,459 -118,544
  rectangle: -155,459 -143,544
  rectangle: -180,459 -168,544
  rectangle: -205,459 -193,544
  rectangle: -230,459 -218,544
  rectangle: -255,459 -243,544
  rectangle: -280,459 -268,544
  rectangle: -305,459 -293,544
  rectangle: -330,459 -318,544
  rectangle: -355,459 -343,544
  rectangle: -380,459 -368,544
  rectangle: -405,459 -393,544
  rectangle: 345,459 357,544
  rectangle: 370,459 382,544
  rectangle: 395,459 407,544
  rectangle: -562,396 -477,408
  rectangle: -562,371 -477,383
  rectangle: -562,346 -477,358
  rectangle: -562,321 -477,333
  rectangle: -562,296 -477,308
  rectangle: -562,271 -477,283
  rectangle: -562,246 -477,258
  rectangle: -562,221 -477,233
  rectangle: -562,196 -477,208
  rectangle: -562,171 -477,183
  rectangle: -562,146 -477,158
  rectangle: -562,121 -477,133
  rectangle: -562,96 -477,108
  rectangle: -562,71 -477,83
  rectangle: -562,46 -477,58
  rectangle: -562,21 -477,33
  rectangle: -562,-4 -477,8
  rectangle: -562,-29 -477,-17
  rectangle: -562,-54 -477,-42
  rectangle: -562,-79 -477,-67
  rectangle: -562,-104 -477,-92
  rectangle: -562,-129 -477,-117
  rectangle: -562,-154 -477,-142
  rectangle: -562,-179 -477,-167
  rectangle: -562,-204 -477,-192
  rectangle: -562,-229 -477,-217
  rectangle: -562,-254 -477,-242
  rectangle: -562,-279 -477,-267
  rectangle: -562,-304 -477,-292
  rectangle: -562,-329 -477,-317
  rectangle: -562,-354 -477,-342
  rectangle: -562,-379 -477,-367
  rectangle: -562,-404 -477,-392
  rectangle: 395,-579 407,-494
  rectangle: 370,-579 382,-494
  rectangle: 345,-579 357,-494
  rectangle: 320,-579 332,-494
  rectangle: 295,-579 307,-494
  rectangle: 270,-579 282,-494
  rectangle: 245,-579 257,-494
  rectangle: 220,-579 232,-494
  rectangle: 195,-579 207,-494
  rectangle: 170,-579 182,-494
  rectangle: 145,-579 157,-494
  rectangle: 120,-579 132,-494
  rectangle: 95,-579 107,-494
  rectangle: 70,-579 82,-494
  rectangle: 45,-579 57,-494
  rectangle: 20,-579 32,-494
  rectangle: -5,-579 7,-494
  rectangle: -30,-579 -18,-494
  rectangle: -55,-579 -43,-494
  rectangle: -80,-579 -68,-494
  rectangle: -105,-579 -93,-494
  rectangle: -130,-579 -118,-494
  rectangle: -155,-579 -143,-494
  rectangle: -180,-579 -168,-494
  rectangle: -205,-579 -193,-494
  rectangle: -230,-579 -218,-494
  rectangle: -255,-579 -243,-494
  rectangle: -280,-579 -268,-494
  rectangle: -305,-579 -293,-494
  rectangle: -330,-579 -318,-494
  rectangle: -355,-579 -343,-494
  rectangle: -380,-579 -368,-494
  rectangle: -405,-579 -393,-494

## QSOP16 [mm]
pads (16):
  rect 0.4x1 smd: 1(-2.223,-2.75) 2(-1.588,-2.75) 3(-0.953,-2.75) 4(-0.318,-2.75) 5(0.318,-2.75) 6(0.953,-2.75) 7(1.588,-2.75) 8(2.223,-2.75) 9(2.223,2.75) 10(1.588,2.75) 11(0.953,2.75) 12(0.318,2.75) 13(-0.318,2.75) 14(-0.953,2.75) 15(-1.588,2.75) 16(-2.223,2.75)
Top Overlay:
  circle w0: c-2,-1.5 r0.2
  lines w0.203: -2.4,-1.89 -2.4,1.89 ; -2.38,-1.89 2.4,-1.89 2.4,1.89 -2.38,1.89
Mechanical 16:
  rectangle: -2.373,-3.1 -2.072,-2
  rectangle: -1.738,-3.1 -1.437,-2
  rectangle: -1.103,-3.1 -0.802,-2
  rectangle: -0.468,-3.1 -0.167,-2
  rectangle: 0.167,-3.1 0.468,-2
  rectangle: 0.802,-3.1 1.103,-2
  rectangle: 1.437,-3.1 1.738,-2
  rectangle: 2.072,-3.1 2.373,-2
  rectangle: 2.072,2 2.373,3.1
  rectangle: 1.437,2 1.738,3.1
  rectangle: 0.802,2 1.103,3.1
  rectangle: 0.167,2 0.468,3.1
  rectangle: -0.468,2 -0.167,3.1
  rectangle: -1.103,2 -0.802,3.1
  rectangle: -1.738,2 -1.437,3.1
  rectangle: -2.373,2 -2.072,3.1

## QSOP20 [mm]
pads (20):
  rect 0.4x1 smd: 1(-2.858,-2.75) 2(-2.223,-2.75) 3(-1.588,-2.75) 4(-0.953,-2.75) 5(-0.318,-2.75) 6(0.318,-2.75) 7(0.953,-2.75) 8(1.588,-2.75) 9(2.223,-2.75) 10(2.858,-2.75) 11(2.858,2.75) 12(2.223,2.75) 13(1.588,2.75) 14(0.953,2.75) 15(0.318,2.75) 16(-0.318,2.75) 17(-0.953,2.75) 18(-1.588,2.75) 19(-2.223,2.75) 20(-2.858,2.75)
Top Overlay:
  circle w0: c-2.635,-1.5 r0.2
  lines w0.203: -4.235,-1.89 4.235,-1.89 4.235,1.89 -4.235,1.89 -4.235,-1.89
Mechanical 16:
  rectangle: -3.008,-3.1 -2.707,-2
  rectangle: -2.373,-3.1 -2.072,-2
  rectangle: -1.738,-3.1 -1.437,-2
  rectangle: -1.103,-3.1 -0.802,-2
  rectangle: -0.468,-3.1 -0.167,-2
  rectangle: 0.167,-3.1 0.468,-2
  rectangle: 0.802,-3.1 1.103,-2
  rectangle: 1.437,-3.1 1.738,-2
  rectangle: 2.072,-3.1 2.373,-2
  rectangle: 2.707,-3.1 3.008,-2
  rectangle: 2.707,2 3.008,3.1
  rectangle: 2.072,2 2.373,3.1
  rectangle: 1.437,2 1.738,3.1
  rectangle: 0.802,2 1.103,3.1
  rectangle: 0.167,2 0.468,3.1
  rectangle: -0.468,2 -0.167,3.1
  rectangle: -1.103,2 -0.802,3.1
  rectangle: -1.738,2 -1.437,3.1
  rectangle: -2.373,2 -2.072,3.1
  rectangle: -3.008,2 -2.707,3.1

## R0402 [mm]
pads (2):
  rect 0.7x0.9 smd: 1(-0.65,0) 2(0.65,0)
Mechanical 6:
  rectangle: -0.2,-0.4 0.2,0.4
Mechanical 16:
  rectangle: -0.554,-0.305 -0.254,0.295
  rectangle: 0.259,-0.305 0.559,0.295
  lines w0.152: -0.245,-0.224 0.245,-0.224 ; -0.245,0.224 0.245,0.224
Mechanical 27:
  lines w0.051: -1.473,-0.483 1.473,-0.483 1.473,0.483 -1.473,0.483 -1.473,-0.483

## R0603 [mm]
pads (2):
  rect 1x1.1 smd: 1(-0.85,0) 2(0.85,0)
Mechanical 6:
  rectangle: -0.2,-0.4 0.2,0.4
Mechanical 16:
  rectangle: 0.432,-0.432 0.838,0.432
  rectangle: -0.838,-0.432 -0.432,0.432
  lines w0.152: -0.432,-0.356 0.432,-0.356 ; -0.432,0.356 0.432,0.356
Mechanical 27:
  lines w0.051: -1.473,-0.983 1.473,-0.983 1.473,0.983 -1.473,0.983 -1.473,-0.983

## R0805 [mil]
pads (2):
  rect 51.18x59.06 smd: 1(-37.4,0) 2(37.4,0)
Mechanical 6:
  rectangle: -7.87,-19.69 7.87,19.69
Mechanical 16:
  rectangle: 16,-27.5 41.59,27.62
  rectangle: -42,-27.5 -16.41,27.62
  lines w6: -16.14,-25 16.14,-25 ; -16.14,25 16.14,25
Mechanical 27:
  lines w2: -77.68,-38.7 77.68,-38.7 77.68,38.7 -77.68,38.7 -77.68,-38.7

## R0805W [mm]
pads (2):
  rect 1.5x1 smd: 1(-1.053,0) 2(1.053,0)
Mechanical 6:
  rectangle: -0.2,-0.5 0.2,0.5
Mechanical 16:
  rectangle: 0.406,-0.699 1.056,0.702
  rectangle: -1.067,-0.699 -0.417,0.702
  lines w0.152: -0.41,-0.635 0.41,-0.635 ; -0.41,0.635 0.41,0.635
Mechanical 27:
  lines w0.051: -1.973,-0.983 1.973,-0.983 1.973,0.983 -1.973,0.983 -1.973,-0.983

## R1005 [mm]
pads (2):
  rect 0.7x0.9 smd: 1(-0.65,0) 2(0.65,0)
Mechanical 6:
  rectangle: -0.2,-0.3 0.2,0.3
Mechanical 16:
  rectangle: -0.554,-0.305 -0.254,0.295
  rectangle: 0.259,-0.305 0.559,0.295
  lines w0.152: -0.245,-0.224 0.245,-0.224 ; -0.245,0.224 0.245,0.224
Mechanical 27:
  lines w0.051: -1.473,-0.483 1.473,-0.483 1.473,0.483 -1.473,0.483 -1.473,-0.483

## R1206 [mil]
pads (2):
  rect 62.99x70.98 smd: 1(-55.98,0) 2(55.98,0)
Mechanical 6:
  rectangle: -11.81,-27.56 11.81,27.56
Mechanical 16:
  rectangle: -66.5,-34.5 -37.5,34.5
  rectangle: 37.5,-34.5 66.5,34.5
  lines w6: -38,-32 37.5,-32 ; -38,32 37.5,32
Mechanical 27:
  lines w2: -97.36,-38.7 97.36,-38.7 97.36,38.7 -97.36,38.7 -97.36,-38.7

## R1206W [mil]
pads (2):
  rect 70.87x47.24 smd: 1(-59.02,0) 2(59.02,0)
Mechanical 6:
  rectangle: -11.81,-27.56 11.81,27.56
Mechanical 16:
  rectangle: -65,-34.5 -35.47,34.4
  rectangle: 35,-34.5 64.53,34.4
  lines w6: -35.94,-31.5 34.96,-31.5 ; -35.94,31.5 34.96,31.5
Mechanical 27:
  lines w2: -97.36,-38.7 97.36,-38.7 97.36,38.7 -97.36,38.7 -97.36,-38.7